# Altium footprint library Molex FFC - FPC Connectors (SMT).PcbLib: 638 footprints (part 25 of 40)
Each footprint in its own frame and in the unit in brackets; x right, y up, seen from the top. Pads: shape width x height; smd on the part's side, far side on the other; paste and mask are expansions set on the pad; w line width, h text height; cw(c..) or ccw(c..) is an arc to the next point about the centre after c.
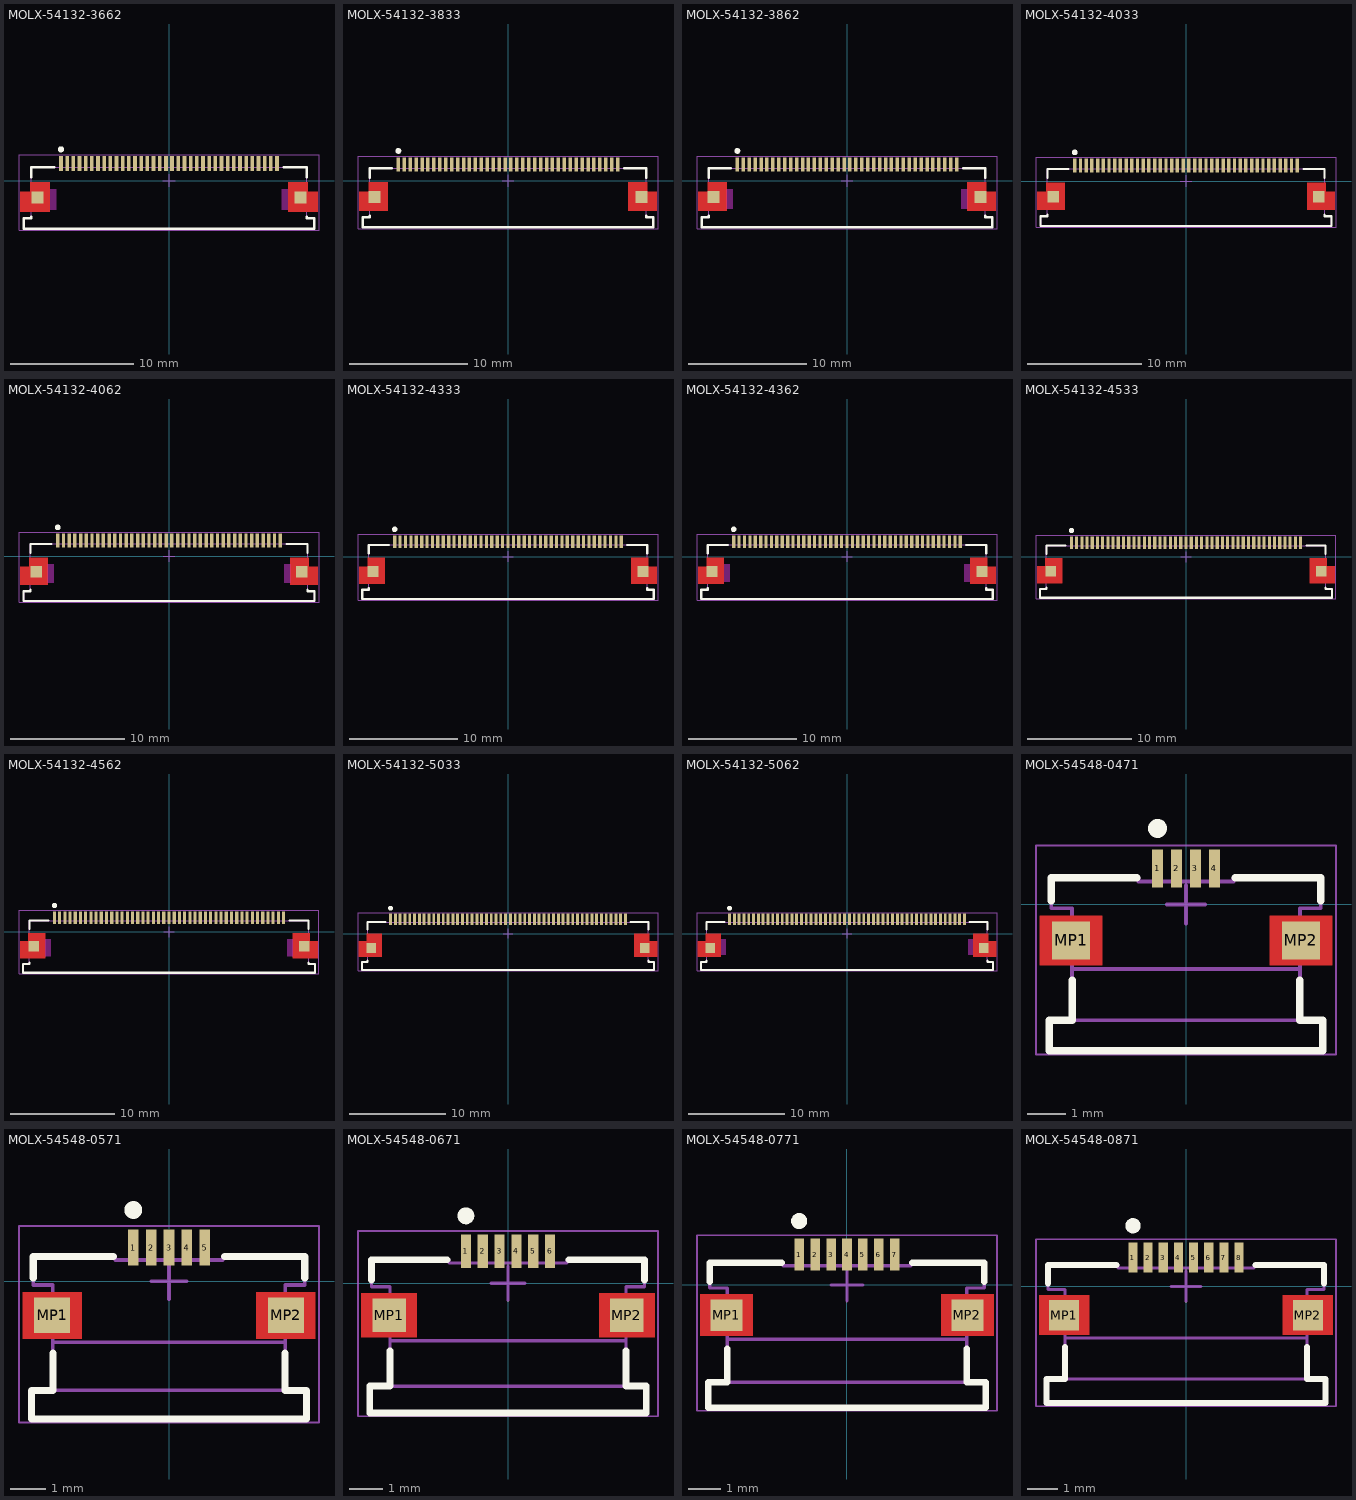
[diagram p24: the footprints below, top view; thin cyan lines are the x and y axes]

## MOLX-54132-3662 [mm] "FPC Connector, 36-Leads, Right Angle, Pitch 0.5 mm, Mated Height 2.0 mm, SMT"
height 2.002
pads (38):
  rect 0.3x1.2 smd: 1(-8.75,1.375) 2(-8.25,1.375) 3(-7.75,1.375) 4(-7.25,1.375) 5(-6.75,1.375) 6(-6.25,1.375) 7(-5.75,1.375) 8(-5.25,1.375) 9(-4.75,1.375) 10(-4.25,1.375) 11(-3.75,1.375) 12(-3.25,1.375) 13(-2.75,1.375) 14(-2.25,1.375) 15(-1.75,1.375) 16(-1.25,1.375) 17(-0.75,1.375) 18(-0.25,1.375) 19(0.25,1.375) 20(0.75,1.375) 21(1.25,1.375) 22(1.75,1.375) 23(2.25,1.375) 24(2.75,1.375) 25(3.25,1.375) 26(3.75,1.375) 27(4.25,1.375) 28(4.75,1.375) 29(5.25,1.375) 30(5.75,1.375) 31(6.25,1.375) 32(6.75,1.375) 33(7.25,1.375) 34(7.75,1.375) 35(8.25,1.375) 36(8.75,1.375)
  rect 1x1 smd: MP1(-10.65,-1.375) MP2(10.65,-1.375)
Top Layer:
  region: 9.65,-0.125 11.25,-0.125 11.25,-0.925 12.05,-0.925 12.05,-2.525 9.65,-2.525
  region: -9.65,-0.125 -11.25,-0.125 -11.25,-0.925 -12.05,-0.925 -12.05,-2.525 -9.65,-2.525
Top Overlay:
  circle w0.25: c-8.75,2.525 r0.125
  lines w0.2: -11.15,-2.925 -11.15,-3.075 -11.75,-3.075 -11.75,-3.925 11.75,-3.925 11.75,-3.075 11.15,-3.075 11.15,-2.925 ; -11.15,0.275 -11.15,1.075 -9.3,1.075 ; 9.3,1.075 11.15,1.075 11.15,0.275
Keep-Out Layer:
  rectangle: 9.1,-2.375 9.65,-0.675
  region: -9.1,-0.675 -9.65,-0.675 -9.65,-2.375 -9.1,-2.375
Mechanical 13:
  lines w0.1: -11.75,-3.925 -11.75,-3.075 -11.15,-3.075 -11.15,1.075 11.15,1.075 11.15,-3.075 11.75,-3.075 11.75,-3.925 -11.75,-3.925
Mechanical 15:
  lines w0.05: -12.15,-4.025 12.15,-4.025 12.15,2.075 -12.15,2.075 -12.15,-4.025
  lines w0.1: -0.5,0 0.5,0 ; 0,-0.5 0,0.5
3D body: height 0.25, standoff 0, extent -11.75,-3.925 11.75,1.675

## MOLX-54132-3833 [mm] "FPC Connector, 38-Leads, Right Angle, Pitch 0.5 mm, Mated Height 2.0 mm, SMT"
height 2.002
pads (40):
  rect 0.3x1.2 smd: 1(-9.25,1.375) 2(-8.75,1.375) 3(-8.25,1.375) 4(-7.75,1.375) 5(-7.25,1.375) 6(-6.75,1.375) 7(-6.25,1.375) 8(-5.75,1.375) 9(-5.25,1.375) 10(-4.75,1.375) 11(-4.25,1.375) 12(-3.75,1.375) 13(-3.25,1.375) 14(-2.75,1.375) 15(-2.25,1.375) 16(-1.75,1.375) 17(-1.25,1.375) 18(-0.75,1.375) 19(-0.25,1.375) 20(0.25,1.375) 21(0.75,1.375) 22(1.25,1.375) 23(1.75,1.375) 24(2.25,1.375) 25(2.75,1.375) 26(3.25,1.375) 27(3.75,1.375) 28(4.25,1.375) 29(4.75,1.375) 30(5.25,1.375) 31(5.75,1.375) 32(6.25,1.375) 33(6.75,1.375) 34(7.25,1.375) 35(7.75,1.375) 36(8.25,1.375) 37(8.75,1.375) 38(9.25,1.375)
  rect 1x1 smd: MP1(-11.25,-1.375) MP2(11.25,-1.375)
Top Layer:
  region: 10.15,-0.125 11.75,-0.125 11.75,-0.925 12.55,-0.925 12.55,-2.525 10.15,-2.525
  region: -10.15,-0.125 -11.75,-0.125 -11.75,-0.925 -12.55,-0.925 -12.55,-2.525 -10.15,-2.525
Top Overlay:
  circle w0.25: c-9.25,2.525 r0.125
  lines w0.2: -11.65,-2.925 -11.65,-3.075 -12.25,-3.075 -12.25,-3.925 12.25,-3.925 12.25,-3.075 11.65,-3.075 11.65,-2.925 ; -11.65,0.275 -11.65,1.075 -9.8,1.075 ; 9.8,1.075 11.65,1.075 11.65,0.275
Mechanical 13:
  lines w0.1: -12.25,-3.925 12.25,-3.925 12.25,-3.075 11.65,-3.075 11.65,1.075 -11.65,1.075 -11.65,-3.075 -12.25,-3.075 -12.25,-3.925
Mechanical 15:
  lines w0.05: -12.65,-4.025 12.65,-4.025 12.65,2.075 -12.65,2.075 -12.65,-4.025
  lines w0.1: -0.5,0 0.5,0 ; 0,-0.5 0,0.5
3D body: height 0.25, standoff 0, extent -12.25,-3.925 12.25,1.675

## MOLX-54132-3862 [mm] "FPC Connector, 38-Leads, Right Angle, Pitch 0.5 mm, Mated Height 2.0 mm, SMT"
height 2.002
pads (40):
  rect 0.3x1.2 smd: 1(-9.25,1.375) 2(-8.75,1.375) 3(-8.25,1.375) 4(-7.75,1.375) 5(-7.25,1.375) 6(-6.75,1.375) 7(-6.25,1.375) 8(-5.75,1.375) 9(-5.25,1.375) 10(-4.75,1.375) 11(-4.25,1.375) 12(-3.75,1.375) 13(-3.25,1.375) 14(-2.75,1.375) 15(-2.25,1.375) 16(-1.75,1.375) 17(-1.25,1.375) 18(-0.75,1.375) 19(-0.25,1.375) 20(0.25,1.375) 21(0.75,1.375) 22(1.25,1.375) 23(1.75,1.375) 24(2.25,1.375) 25(2.75,1.375) 26(3.25,1.375) 27(3.75,1.375) 28(4.25,1.375) 29(4.75,1.375) 30(5.25,1.375) 31(5.75,1.375) 32(6.25,1.375) 33(6.75,1.375) 34(7.25,1.375) 35(7.75,1.375) 36(8.25,1.375) 37(8.75,1.375) 38(9.25,1.375)
  rect 1x1 smd: MP1(-11.25,-1.375) MP2(11.25,-1.375)
Top Layer:
  region: -10.15,-0.125 -11.75,-0.125 -11.75,-0.925 -12.55,-0.925 -12.55,-2.525 -10.15,-2.525
  region: 10.15,-0.125 11.75,-0.125 11.75,-0.925 12.55,-0.925 12.55,-2.525 10.15,-2.525
Top Overlay:
  circle w0.25: c-9.25,2.525 r0.125
  lines w0.2: -11.65,-2.925 -11.65,-3.075 -12.25,-3.075 -12.25,-3.925 12.25,-3.925 12.25,-3.075 11.65,-3.075 11.65,-2.925 ; -11.65,0.275 -11.65,1.075 -9.8,1.075 ; 9.8,1.075 11.65,1.075 11.65,0.275
Keep-Out Layer:
  region: -9.6,-0.675 -10.15,-0.675 -10.15,-2.375 -9.6,-2.375
  rectangle: 9.6,-2.375 10.15,-0.675
Mechanical 13:
  lines w0.1: -12.25,-3.925 -12.25,-3.075 -11.65,-3.075 -11.65,1.075 11.65,1.075 11.65,-3.075 12.25,-3.075 12.25,-3.925 -12.25,-3.925
Mechanical 15:
  lines w0.05: -12.65,-4.025 -12.65,2.075 12.65,2.075 12.65,-4.025 -12.65,-4.025
  lines w0.1: -0.5,0 0.5,0 ; 0,-0.5 0,0.5
3D body: height 0.25, standoff 0, extent -12.25,-3.925 12.25,1.675

## MOLX-54132-4033 [mm] "FPC Connector, 40-Leads, Right Angle, Pitch 0.5 mm, Mated Height 2.0 mm, SMT"
height 2.002
pads (42):
  rect 0.3x1.2 smd: 1(-9.75,1.375) 2(-9.25,1.375) 3(-8.75,1.375) 4(-8.25,1.375) 5(-7.75,1.375) 6(-7.25,1.375) 7(-6.75,1.375) 8(-6.25,1.375) 9(-5.75,1.375) 10(-5.25,1.375) 11(-4.75,1.375) 12(-4.25,1.375) 13(-3.75,1.375) 14(-3.25,1.375) 15(-2.75,1.375) 16(-2.25,1.375) 17(-1.75,1.375) 18(-1.25,1.375) 19(-0.75,1.375) 20(-0.25,1.375) 21(0.25,1.375) 22(0.75,1.375) 23(1.25,1.375) 24(1.75,1.375) 25(2.25,1.375) 26(2.75,1.375) 27(3.25,1.375) 28(3.75,1.375) 29(4.25,1.375) 30(4.75,1.375) 31(5.25,1.375) 32(5.75,1.375) 33(6.25,1.375) 34(6.75,1.375) 35(7.25,1.375) 36(7.75,1.375) 37(8.25,1.375) 38(8.75,1.375) 39(9.25,1.375) 40(9.75,1.375)
  rect 1x1 smd: MP1(-11.65,-1.375) MP2(11.65,-1.375)
Top Layer:
  region: -10.65,-0.125 -12.25,-0.125 -12.25,-0.925 -13.05,-0.925 -13.05,-2.525 -10.65,-2.525
  region: 10.65,-0.125 12.25,-0.125 12.25,-0.925 13.05,-0.925 13.05,-2.525 10.65,-2.525
Top Overlay:
  circle w0.25: c-9.75,2.525 r0.125
  lines w0.2: -12.15,-2.925 -12.15,-3.075 -12.75,-3.075 -12.75,-3.925 12.75,-3.925 12.75,-3.075 12.15,-3.075 12.15,-2.925 ; -12.15,0.275 -12.15,1.075 -10.3,1.075 ; 10.3,1.075 12.15,1.075 12.15,0.275
Mechanical 13:
  lines w0.1: -12.75,-3.925 12.75,-3.925 12.75,-3.075 12.15,-3.075 12.15,1.075 -12.15,1.075 -12.15,-3.075 -12.75,-3.075 -12.75,-3.925
Mechanical 15:
  lines w0.05: -13.15,-4.025 -13.15,2.075 13.15,2.075 13.15,-4.025 -13.15,-4.025
  lines w0.1: -0.5,0 0.5,0 ; 0,-0.5 0,0.5
3D body: height 0.25, standoff 0, extent -12.75,-3.925 12.75,1.675

## MOLX-54132-4062 [mm] "FPC Connector, 40-Leads, Right Angle, Pitch 0.5 mm, Mated Height 2.0 mm, SMT"
height 2.002
pads (42):
  rect 0.3x1.2 smd: 1(-9.75,1.375) 2(-9.25,1.375) 3(-8.75,1.375) 4(-8.25,1.375) 5(-7.75,1.375) 6(-7.25,1.375) 7(-6.75,1.375) 8(-6.25,1.375) 9(-5.75,1.375) 10(-5.25,1.375) 11(-4.75,1.375) 12(-4.25,1.375) 13(-3.75,1.375) 14(-3.25,1.375) 15(-2.75,1.375) 16(-2.25,1.375) 17(-1.75,1.375) 18(-1.25,1.375) 19(-0.75,1.375) 20(-0.25,1.375) 21(0.25,1.375) 22(0.75,1.375) 23(1.25,1.375) 24(1.75,1.375) 25(2.25,1.375) 26(2.75,1.375) 27(3.25,1.375) 28(3.75,1.375) 29(4.25,1.375) 30(4.75,1.375) 31(5.25,1.375) 32(5.75,1.375) 33(6.25,1.375) 34(6.75,1.375) 35(7.25,1.375) 36(7.75,1.375) 37(8.25,1.375) 38(8.75,1.375) 39(9.25,1.375) 40(9.75,1.375)
  rect 1x1 smd: MP1(-11.65,-1.375) MP2(11.65,-1.375)
Top Layer:
  region: -10.65,-0.125 -12.25,-0.125 -12.25,-0.925 -13.05,-0.925 -13.05,-2.525 -10.65,-2.525
  region: 10.65,-0.125 12.25,-0.125 12.25,-0.925 13.05,-0.925 13.05,-2.525 10.65,-2.525
Top Overlay:
  circle w0.25: c-9.75,2.525 r0.125
  lines w0.2: -12.15,-2.925 -12.15,-3.075 -12.75,-3.075 -12.75,-3.925 12.75,-3.925 12.75,-3.075 12.15,-3.075 12.15,-2.925 ; -12.15,0.275 -12.15,1.075 -10.3,1.075 ; 10.3,1.075 12.15,1.075 12.15,0.275
Keep-Out Layer:
  region: -10.1,-0.675 -10.65,-0.675 -10.65,-2.375 -10.1,-2.375
  rectangle: 10.1,-2.375 10.65,-0.675
Mechanical 13:
  lines w0.1: -12.75,-3.925 12.75,-3.925 12.75,-3.075 12.15,-3.075 12.15,1.075 -12.15,1.075 -12.15,-3.075 -12.75,-3.075 -12.75,-3.925
Mechanical 15:
  lines w0.05: -13.15,-4.025 -13.15,2.075 13.15,2.075 13.15,-4.025 -13.15,-4.025
  lines w0.1: -0.5,0 0.5,0 ; 0,-0.5 0,0.5
3D body: height 0.25, standoff 0, extent -12.75,-3.925 12.75,1.675

## MOLX-54132-4333 [mm] "FPC Connector, 43-Leads, Right Angle, Pitch 0.5 mm, Mated Height 2.0 mm, SMT"
height 2.002
pads (45):
  rect 0.3x1.2 smd: 1(-10.5,1.375) 2(-10,1.375) 3(-9.5,1.375) 4(-9,1.375) 5(-8.5,1.375) 6(-8,1.375) 7(-7.5,1.375) 8(-7,1.375) 9(-6.5,1.375) 10(-6,1.375) 11(-5.5,1.375) 12(-5,1.375) 13(-4.5,1.375) 14(-4,1.375) 15(-3.5,1.375) 16(-3,1.375) 17(-2.5,1.375) 18(-2,1.375) 19(-1.5,1.375) 20(-1,1.375) 21(-0.5,1.375) 22(0,1.375) 23(0.5,1.375) 24(1,1.375) 25(1.5,1.375) 26(2,1.375) 27(2.5,1.375) 28(3,1.375) 29(3.5,1.375) 30(4,1.375) 31(4.5,1.375) 32(5,1.375) 33(5.5,1.375) 34(6,1.375) 35(6.5,1.375) 36(7,1.375) 37(7.5,1.375) 38(8,1.375) 39(8.5,1.375) 40(9,1.375) 41(9.5,1.375) 42(10,1.375) 43(10.5,1.375)
  rect 1x1 smd: MP1(-12.5,-1.375) MP2(12.5,-1.375)
Top Layer:
  region: 11.4,-0.125 13,-0.125 13,-0.925 13.8,-0.925 13.8,-2.525 11.4,-2.525
  region: -11.4,-0.125 -13,-0.125 -13,-0.925 -13.8,-0.925 -13.8,-2.525 -11.4,-2.525
Top Overlay:
  circle w0.25: c-10.5,2.525 r0.125
  lines w0.2: -12.9,-2.925 -12.9,-3.075 -13.5,-3.075 -13.5,-3.925 13.5,-3.925 13.5,-3.075 12.9,-3.075 12.9,-2.925 ; -12.9,0.275 -12.9,1.075 -11.05,1.075 ; 11.05,1.075 12.9,1.075 12.9,0.275
Mechanical 13:
  lines w0.1: -13.5,-3.925 -13.5,-3.075 -12.9,-3.075 -12.9,1.075 12.9,1.075 12.9,-3.075 13.5,-3.075 13.5,-3.925 -13.5,-3.925
Mechanical 15:
  lines w0.05: -13.9,-4.025 13.9,-4.025 13.9,2.075 -13.9,2.075 -13.9,-4.025
  lines w0.1: -0.5,0 0.5,0 ; 0,-0.5 0,0.5
3D body: height 0.25, standoff 0, extent -13.5,-3.925 13.5,1.675

## MOLX-54132-4362 [mm] "FPC Connector, 43-Leads, Right Angle, Pitch 0.5 mm, Mated Height 2.0 mm, SMT"
height 2.002
pads (45):
  rect 0.3x1.2 smd: 1(-10.5,1.375) 2(-10,1.375) 3(-9.5,1.375) 4(-9,1.375) 5(-8.5,1.375) 6(-8,1.375) 7(-7.5,1.375) 8(-7,1.375) 9(-6.5,1.375) 10(-6,1.375) 11(-5.5,1.375) 12(-5,1.375) 13(-4.5,1.375) 14(-4,1.375) 15(-3.5,1.375) 16(-3,1.375) 17(-2.5,1.375) 18(-2,1.375) 19(-1.5,1.375) 20(-1,1.375) 21(-0.5,1.375) 22(0,1.375) 23(0.5,1.375) 24(1,1.375) 25(1.5,1.375) 26(2,1.375) 27(2.5,1.375) 28(3,1.375) 29(3.5,1.375) 30(4,1.375) 31(4.5,1.375) 32(5,1.375) 33(5.5,1.375) 34(6,1.375) 35(6.5,1.375) 36(7,1.375) 37(7.5,1.375) 38(8,1.375) 39(8.5,1.375) 40(9,1.375) 41(9.5,1.375) 42(10,1.375) 43(10.5,1.375)
  rect 1x1 smd: MP1(-12.5,-1.375) MP2(12.5,-1.375)
Top Layer:
  region: 11.4,-0.125 13,-0.125 13,-0.925 13.8,-0.925 13.8,-2.525 11.4,-2.525
  region: -11.4,-0.125 -13,-0.125 -13,-0.925 -13.8,-0.925 -13.8,-2.525 -11.4,-2.525
Top Overlay:
  circle w0.25: c-10.5,2.525 r0.125
  lines w0.2: -12.9,-2.925 -12.9,-3.075 -13.5,-3.075 -13.5,-3.925 13.5,-3.925 13.5,-3.075 12.9,-3.075 12.9,-2.925 ; -12.9,0.275 -12.9,1.075 -11.05,1.075 ; 11.05,1.075 12.9,1.075 12.9,0.275
Keep-Out Layer:
  rectangle: 10.85,-2.375 11.4,-0.675
  region: -10.85,-0.675 -11.4,-0.675 -11.4,-2.375 -10.85,-2.375
Mechanical 13:
  lines w0.1: -13.5,-3.925 -13.5,-3.075 -12.9,-3.075 -12.9,1.075 12.9,1.075 12.9,-3.075 13.5,-3.075 13.5,-3.925 -13.5,-3.925
Mechanical 15:
  lines w0.05: -13.9,-4.025 13.9,-4.025 13.9,2.075 -13.9,2.075 -13.9,-4.025
  lines w0.1: -0.5,0 0.5,0 ; 0,-0.5 0,0.5
3D body: height 0.25, standoff 0, extent -13.5,-3.925 13.5,1.675

## MOLX-54132-4533 [mm] "FPC Connector, 45-Leads, Right Angle, Pitch 0.5 mm, Mated Height 2.0 mm, SMT"
height 2.002
pads (47):
  rect 0.3x1.2 smd: 1(-11,1.375) 2(-10.5,1.375) 3(-10,1.375) 4(-9.5,1.375) 5(-9,1.375) 6(-8.5,1.375) 7(-8,1.375) 8(-7.5,1.375) 9(-7,1.375) 10(-6.5,1.375) 11(-6,1.375) 12(-5.5,1.375) 13(-5,1.375) 14(-4.5,1.375) 15(-4,1.375) 16(-3.5,1.375) 17(-3,1.375) 18(-2.5,1.375) 19(-2,1.375) 20(-1.5,1.375) 21(-1,1.375) 22(-0.5,1.375) 23(0,1.375) 24(0.5,1.375) 25(1,1.375) 26(1.5,1.375) 27(2,1.375) 28(2.5,1.375) 29(3,1.375) 30(3.5,1.375) 31(4,1.375) 32(4.5,1.375) 33(5,1.375) 34(5.5,1.375) 35(6,1.375) 36(6.5,1.375) 37(7,1.375) 38(7.5,1.375) 39(8,1.375) 40(8.5,1.375) 41(9,1.375) 42(9.5,1.375) 43(10,1.375) 44(10.5,1.375) 45(11,1.375)
  rect 1x1 smd: MP1(-13,-1.375) MP2(13,-1.375)
Top Layer:
  region: -11.9,-0.125 -13.5,-0.125 -13.5,-0.925 -14.3,-0.925 -14.3,-2.525 -11.9,-2.525
  region: 11.9,-0.125 13.5,-0.125 13.5,-0.925 14.3,-0.925 14.3,-2.525 11.9,-2.525
Top Overlay:
  circle w0.25: c-11,2.525 r0.125
  lines w0.2: -13.4,-2.925 -13.4,-3.075 -14,-3.075 -14,-3.925 14,-3.925 14,-3.075 13.4,-3.075 13.4,-2.925 ; -13.4,0.275 -13.4,1.075 -11.55,1.075 ; 11.55,1.075 13.4,1.075 13.4,0.275
Mechanical 13:
  lines w0.1: -14,-3.925 14,-3.925 14,-3.075 13.4,-3.075 13.4,1.075 -13.4,1.075 -13.4,-3.075 -14,-3.075 -14,-3.925
Mechanical 15:
  lines w0.05: -14.4,-4.025 -14.4,2.075 14.4,2.075 14.4,-4.025 -14.4,-4.025
  lines w0.1: -0.5,0 0.5,0 ; 0,-0.5 0,0.5
3D body: height 0.25, standoff 0, extent -14,-3.925 14,1.675

## MOLX-54132-4562 [mm] "FPC Connector, 45-Leads, Right Angle, Pitch 0.5 mm, Mated Height 2.0 mm, SMT"
height 2.002
pads (47):
  rect 0.3x1.2 smd: 1(-11,1.375) 2(-10.5,1.375) 3(-10,1.375) 4(-9.5,1.375) 5(-9,1.375) 6(-8.5,1.375) 7(-8,1.375) 8(-7.5,1.375) 9(-7,1.375) 10(-6.5,1.375) 11(-6,1.375) 12(-5.5,1.375) 13(-5,1.375) 14(-4.5,1.375) 15(-4,1.375) 16(-3.5,1.375) 17(-3,1.375) 18(-2.5,1.375) 19(-2,1.375) 20(-1.5,1.375) 21(-1,1.375) 22(-0.5,1.375) 23(0,1.375) 24(0.5,1.375) 25(1,1.375) 26(1.5,1.375) 27(2,1.375) 28(2.5,1.375) 29(3,1.375) 30(3.5,1.375) 31(4,1.375) 32(4.5,1.375) 33(5,1.375) 34(5.5,1.375) 35(6,1.375) 36(6.5,1.375) 37(7,1.375) 38(7.5,1.375) 39(8,1.375) 40(8.5,1.375) 41(9,1.375) 42(9.5,1.375) 43(10,1.375) 44(10.5,1.375) 45(11,1.375)
  rect 1x1 smd: MP1(-13,-1.375) MP2(13,-1.375)
Top Layer:
  region: 11.9,-0.125 13.5,-0.125 13.5,-0.925 14.3,-0.925 14.3,-2.525 11.9,-2.525
  region: -11.9,-0.125 -13.5,-0.125 -13.5,-0.925 -14.3,-0.925 -14.3,-2.525 -11.9,-2.525
Top Overlay:
  circle w0.25: c-11,2.525 r0.125
  lines w0.2: -13.4,-2.925 -13.4,-3.075 -14,-3.075 -14,-3.925 14,-3.925 14,-3.075 13.4,-3.075 13.4,-2.925 ; -13.4,0.275 -13.4,1.075 -11.55,1.075 ; 11.55,1.075 13.4,1.075 13.4,0.275
Keep-Out Layer:
  region: 11.9,-0.675 11.35,-0.675 11.35,-2.375 11.9,-2.375
  rectangle: -11.9,-2.375 -11.35,-0.675
Mechanical 13:
  lines w0.1: -14,-3.925 -14,-3.075 -13.4,-3.075 -13.4,1.075 13.4,1.075 13.4,-3.075 14,-3.075 14,-3.925 -14,-3.925
Mechanical 15:
  lines w0.05: -14.4,-4.025 14.4,-4.025 14.4,2.075 -14.4,2.075 -14.4,-4.025
  lines w0.1: -0.5,0 0.5,0 ; 0,-0.5 0,0.5
3D body: height 0.25, standoff 0, extent -14,-3.925 14,1.675

## MOLX-54132-5033 [mm] "FPC Connector, 50-Leads, Right Angle, Pitch 0.5 mm, Mated Height 2.0 mm, SMT"
height 2.002
pads (52):
  rect 0.3x1.2 smd: 1(-12.25,1.5) 2(-11.75,1.5) 3(-11.25,1.5) 4(-10.75,1.5) 5(-10.25,1.5) 6(-9.75,1.5) 7(-9.25,1.5) 8(-8.75,1.5) 9(-8.25,1.5) 10(-7.75,1.5) 11(-7.25,1.5) 12(-6.75,1.5) 13(-6.25,1.5) 14(-5.75,1.5) 15(-5.25,1.5) 16(-4.75,1.5) 17(-4.25,1.5) 18(-3.75,1.5) 19(-3.25,1.5) 20(-2.75,1.5) 21(-2.25,1.5) 22(-1.75,1.5) 23(-1.25,1.5) 24(-0.75,1.5) 25(-0.25,1.5) 26(0.25,1.5) 27(0.75,1.5) 28(1.25,1.5) 29(1.75,1.5) 30(2.25,1.5) 31(2.75,1.5) 32(3.25,1.5) 33(3.75,1.5) 34(4.25,1.5) 35(4.75,1.5) 36(5.25,1.5) 37(5.75,1.5) 38(6.25,1.5) 39(6.75,1.5) 40(7.25,1.5) 41(7.75,1.5) 42(8.25,1.5) 43(8.75,1.5) 44(9.25,1.5) 45(9.75,1.5) 46(10.25,1.5) 47(10.75,1.5) 48(11.25,1.5) 49(11.75,1.5) 50(12.25,1.5)
  rect 1x1 smd: MP1(-14.25,-1.5) MP2(14.25,-1.5)
Top Layer:
  region: -13.15,0 -14.75,0 -14.75,-0.8 -15.55,-0.8 -15.55,-2.4 -13.15,-2.4
  region: 13.15,0 14.75,0 14.75,-0.8 15.55,-0.8 15.55,-2.4 13.15,-2.4
Top Overlay:
  circle w0.25: c-12.25,2.65 r0.125
  lines w0.2: -14.65,-2.8 -14.65,-2.95 -15.25,-2.95 -15.25,-3.8 15.25,-3.8 15.25,-2.95 14.65,-2.95 14.65,-2.8 ; -14.65,0.4 -14.65,1.2 -12.8,1.2 ; 12.8,1.2 14.65,1.2 14.65,0.4
Mechanical 13:
  lines w0.1: -15.25,-3.8 -15.25,-2.95 -14.65,-2.95 -14.65,1.2 14.65,1.2 14.65,-2.95 15.25,-2.95 15.25,-3.8 -15.25,-3.8
Mechanical 15:
  lines w0.05: -15.65,-3.9 -15.65,2.2 15.65,2.2 15.65,-3.9 -15.65,-3.9
  lines w0.1: -0.5,0 0.5,0 ; 0,-0.5 0,0.5
3D body: height 0.25, standoff 0, extent -15.25,-3.8 15.25,1.8

## MOLX-54132-5062 [mm] "FPC Connector, 50-Leads, Right Angle, Pitch 0.5 mm, Mated Height 2.0 mm, SMT"
height 2.002
pads (52):
  rect 0.3x1.2 smd: 1(-12.25,1.5) 2(-11.75,1.5) 3(-11.25,1.5) 4(-10.75,1.5) 5(-10.25,1.5) 6(-9.75,1.5) 7(-9.25,1.5) 8(-8.75,1.5) 9(-8.25,1.5) 10(-7.75,1.5) 11(-7.25,1.5) 12(-6.75,1.5) 13(-6.25,1.5) 14(-5.75,1.5) 15(-5.25,1.5) 16(-4.75,1.5) 17(-4.25,1.5) 18(-3.75,1.5) 19(-3.25,1.5) 20(-2.75,1.5) 21(-2.25,1.5) 22(-1.75,1.5) 23(-1.25,1.5) 24(-0.75,1.5) 25(-0.25,1.5) 26(0.25,1.5) 27(0.75,1.5) 28(1.25,1.5) 29(1.75,1.5) 30(2.25,1.5) 31(2.75,1.5) 32(3.25,1.5) 33(3.75,1.5) 34(4.25,1.5) 35(4.75,1.5) 36(5.25,1.5) 37(5.75,1.5) 38(6.25,1.5) 39(6.75,1.5) 40(7.25,1.5) 41(7.75,1.5) 42(8.25,1.5) 43(8.75,1.5) 44(9.25,1.5) 45(9.75,1.5) 46(10.25,1.5) 47(10.75,1.5) 48(11.25,1.5) 49(11.75,1.5) 50(12.25,1.5)
  rect 1x1 smd: MP1(-14.25,-1.5) MP2(14.25,-1.5)
Top Layer:
  region: 13.15,0 14.75,0 14.75,-0.8 15.55,-0.8 15.55,-2.4 13.15,-2.4
  region: -13.15,0 -14.75,0 -14.75,-0.8 -15.55,-0.8 -15.55,-2.4 -13.15,-2.4
Top Overlay:
  circle w0.25: c-12.25,2.65 r0.125
  lines w0.2: -14.65,-2.8 -14.65,-2.95 -15.25,-2.95 -15.25,-3.8 15.25,-3.8 15.25,-2.95 14.65,-2.95 14.65,-2.8 ; -14.65,0.4 -14.65,1.2 -12.8,1.2 ; 12.8,1.2 14.65,1.2 14.65,0.4
Keep-Out Layer:
  rectangle: 12.6,-2.25 13.15,-0.55
  region: -12.6,-0.55 -13.15,-0.55 -13.15,-2.25 -12.6,-2.25
Mechanical 13:
  lines w0.1: -15.25,-3.8 15.25,-3.8 15.25,-2.95 14.65,-2.95 14.65,1.2 -14.65,1.2 -14.65,-2.95 -15.25,-2.95 -15.25,-3.8
Mechanical 15:
  lines w0.05: -15.65,-3.9 15.65,-3.9 15.65,2.2 -15.65,2.2 -15.65,-3.9
  lines w0.1: -0.5,0 0.5,0 ; 0,-0.5 0,0.5
3D body: height 0.25, standoff 0, extent -15.25,-3.8 15.25,1.8

## MOLX-54548-0471 [mm] "FPC Connector, 4-Leads, Right Angle, Pitch 0.5 mm, Mated Height 1.2 mm, SMT"
height 1.212
pads (6):
  rect 0.3x1 smd: 1(-0.75,0.95) 2(-0.25,0.95) 3(0.25,0.95) 4(0.75,0.95)
  rect 1x1 smd: MP1(-3.025,-0.95) MP2(3.025,-0.95)
Top Layer:
  region: -3.85,-0.3 -2.2,-0.3 -2.2,-1.6 -3.85,-1.6
  region: 3.85,-0.3 2.2,-0.3 2.2,-1.6 3.85,-1.6
Top Overlay:
  circle w0.25: c-0.75,2 r0.125
  lines w0.2: -3.55,0.1 -3.55,0.7 -1.3,0.7 ; -3,-2 -3,-3.05 -3.6,-3.05 -3.6,-3.849 3.6,-3.849 3.6,-3.05 3,-3.05 3,-2 ; 1.3,0.7 3.55,0.7 3.55,0.1
Mechanical 13:
  lines w0.1: -3,-1.7 3,-1.7 ; -3,-3.05 -3,-0.1 -3.55,-0.1 -3.55,0.7 -1.25,0.7 -1.25,0.6 1.25,0.6 1.25,0.7 3.55,0.7 3.55,-0.1 3,-0.1 3,-3.05 ; -3,-3.05 -3.6,-3.05 -3.6,-3.849 3.6,-3.849 3.6,-3.05 3,-3.05 ; -3,-3.05 3,-3.05
Mechanical 15:
  lines w0.05: -3.95,-3.949 3.95,-3.949 3.95,1.55 -3.95,1.55 -3.95,-3.949
  lines w0.1: -0.5,0 0.5,0 ; 0,-0.5 0,0.5
3D body: height 0.25, standoff 0, extent -3.6,-3.85 3.6,1.15

## MOLX-54548-0571 [mm] "FPC Connector, 5-Leads, Right Angle, Pitch 0.5 mm, Mated Height 1.2 mm, SMT"
height 1.212
pads (7):
  rect 0.3x1 smd: 1(-1,0.95) 2(-0.5,0.95) 3(0,0.95) 4(0.5,0.95) 5(1,0.95)
  rect 1x1 smd: MP1(-3.275,-0.95) MP2(3.275,-0.95)
Top Layer:
  region: 4.1,-0.3 2.45,-0.3 2.45,-1.6 4.1,-1.6
  region: -4.1,-0.3 -2.45,-0.3 -2.45,-1.6 -4.1,-1.6
Top Overlay:
  circle w0.25: c-1,2 r0.125
  lines w0.2: -3.8,0.1 -3.8,0.7 -1.55,0.7 ; -3.25,-2 -3.25,-3.05 -3.85,-3.05 -3.85,-3.849 3.85,-3.849 3.85,-3.05 3.25,-3.05 3.25,-2 ; 1.55,0.7 3.8,0.7 3.8,0.1
Mechanical 13:
  lines w0.1: -3.25,-1.7 3.25,-1.7 ; -3.25,-3.05 3.25,-3.05 ; -3.25,-3.05 -3.85,-3.05 -3.85,-3.849 3.85,-3.849 3.85,-3.05 3.25,-3.05 ; -3.25,-3.05 -3.25,-0.1 -3.8,-0.1 -3.8,0.7 -1.5,0.7 -1.5,0.6 1.5,0.6 1.5,0.7 3.8,0.7 3.8,-0.1 3.25,-0.1 3.25,-3.05
Mechanical 15:
  lines w0.05: -4.2,-3.949 -4.2,1.55 4.2,1.55 4.2,-3.949 -4.2,-3.949
  lines w0.1: -0.5,0 0.5,0 ; 0,-0.5 0,0.5
3D body: height 0.25, standoff 0, extent -3.85,-3.85 3.85,1.15

## MOLX-54548-0671 [mm] "FPC Connector, 6-Leads, Right Angle, Pitch 0.5 mm, Mated Height 1.2 mm, SMT"
height 1.212
pads (8):
  rect 0.3x1 smd: 1(-1.25,0.95) 2(-0.75,0.95) 3(-0.25,0.95) 4(0.25,0.95) 5(0.75,0.95) 6(1.25,0.95)
  rect 1x1 smd: MP1(-3.525,-0.95) MP2(3.525,-0.95)
Top Layer:
  region: 4.35,-0.3 2.7,-0.3 2.7,-1.6 4.35,-1.6
  region: -4.35,-0.3 -2.7,-0.3 -2.7,-1.6 -4.35,-1.6
Top Overlay:
  circle w0.25: c-1.25,2 r0.125
  lines w0.2: -4.05,0.1 -4.05,0.7 -1.8,0.7 ; -3.5,-2 -3.5,-3.05 -4.1,-3.05 -4.1,-3.849 4.1,-3.849 4.1,-3.05 3.5,-3.05 3.5,-2 ; 1.8,0.7 4.05,0.7 4.05,0.1
Mechanical 13:
  lines w0.1: -3.5,-1.7 3.5,-1.7 ; -3.5,-3.05 3.5,-3.05 ; -3.5,-3.05 -4.1,-3.05 -4.1,-3.849 4.1,-3.849 4.1,-3.05 3.5,-3.05 ; -3.5,-3.05 -3.5,-0.1 -4.05,-0.1 -4.05,0.7 -1.75,0.7 -1.75,0.6 1.75,0.6 1.75,0.7 4.05,0.7 4.05,-0.1 3.5,-0.1 3.5,-3.05
Mechanical 15:
  lines w0.05: -4.45,-3.949 -4.45,1.55 4.45,1.55 4.45,-3.949 -4.45,-3.949
  lines w0.1: -0.5,0 0.5,0 ; 0,-0.5 0,0.5
3D body: height 0.25, standoff 0, extent -4.1,-3.85 4.1,1.15

## MOLX-54548-0771 [mm] "FPC Connector, 7-Leads, Right Angle, Pitch 0.5 mm, Mated Height 1.2 mm, SMT"
height 1.212
pads (9):
  rect 0.3x1 smd: 1(-1.5,0.95) 2(-1,0.95) 3(-0.5,0.95) 4(0,0.95) 5(0.5,0.95) 6(1,0.95) 7(1.5,0.95)
  rect 1x1 smd: MP1(-3.775,-0.95) MP2(3.775,-0.95)
Top Layer:
  region: 4.6,-0.3 2.95,-0.3 2.95,-1.6 4.6,-1.6
  region: -4.6,-0.3 -2.95,-0.3 -2.95,-1.6 -4.6,-1.6
Top Overlay:
  circle w0.25: c-1.5,2 r0.125
  lines w0.2: -4.3,0.1 -4.3,0.7 -2.05,0.7 ; -3.75,-2 -3.75,-3.05 -4.35,-3.05 -4.35,-3.849 4.35,-3.849 4.35,-3.05 3.75,-3.05 3.75,-2 ; 2.05,0.7 4.3,0.7 4.3,0.1
Mechanical 13:
  lines w0.1: -3.75,-1.7 3.75,-1.7 ; -3.75,-3.05 3.75,-3.05 ; -3.75,-3.05 -4.35,-3.05 -4.35,-3.849 4.35,-3.849 4.35,-3.05 3.75,-3.05 ; -3.75,-3.05 -3.75,-0.1 -4.3,-0.1 -4.3,0.7 -2,0.7 -2,0.6 2,0.6 2,0.7 4.3,0.7 4.3,-0.1 3.75,-0.1 3.75,-3.05
Mechanical 15:
  lines w0.05: -4.7,-3.949 -4.7,1.55 4.7,1.55 4.7,-3.949 -4.7,-3.949
  lines w0.1: -0.5,0 0.5,0 ; 0,-0.5 0,0.5
3D body: height 0.25, standoff 0, extent -4.35,-3.85 4.35,1.15

## MOLX-54548-0871 [mm] "FPC Connector, 8-Leads, Right Angle, Pitch 0.5 mm, Mated Height 1.2 mm, SMT"
height 1.212
pads (10):
  rect 0.3x1 smd: 1(-1.75,0.95) 2(-1.25,0.95) 3(-0.75,0.95) 4(-0.25,0.95) 5(0.25,0.95) 6(0.75,0.95) 7(1.25,0.95) 8(1.75,0.95)
  rect 1x1 smd: MP1(-4.025,-0.95) MP2(4.025,-0.95)
Top Layer:
  region: -4.85,-0.3 -3.2,-0.3 -3.2,-1.6 -4.85,-1.6
  region: 4.85,-0.3 3.2,-0.3 3.2,-1.6 4.85,-1.6
Top Overlay:
  circle w0.25: c-1.75,2 r0.125
  lines w0.2: -4.55,0.1 -4.55,0.7 -2.3,0.7 ; -4,-2 -4,-3.05 -4.6,-3.05 -4.6,-3.849 4.6,-3.849 4.6,-3.05 4,-3.05 4,-2 ; 2.3,0.7 4.55,0.7 4.55,0.1
Mechanical 13:
  lines w0.1: -4,-1.7 4,-1.7 ; -4,-3.05 4,-3.05 ; -4,-3.05 -4.6,-3.05 -4.6,-3.849 4.6,-3.849 4.6,-3.05 4,-3.05 ; -4,-3.05 -4,-0.1 -4.55,-0.1 -4.55,0.7 -2.25,0.7 -2.25,0.6 2.25,0.6 2.25,0.7 4.55,0.7 4.55,-0.1 4,-0.1 4,-3.05
Mechanical 15:
  lines w0.05: -4.95,-3.949 -4.95,1.55 4.95,1.55 4.95,-3.949 -4.95,-3.949
  lines w0.1: -0.5,0 0.5,0 ; 0,-0.5 0,0.5
3D body: height 0.25, standoff 0, extent -4.6,-3.85 4.6,1.15